# Altium footprint library elk-pi-Sika_revb.PcbLib: 102 footprints (part 5 of 7)
Each footprint in its own frame and in the unit in brackets; x right, y up, seen from the top. Pads: shape width x height; smd on the part's side, far side on the other; paste and mask are expansions set on the pad; w line width, h text height; cw(c..) or ccw(c..) is an arc to the next point about the centre after c.
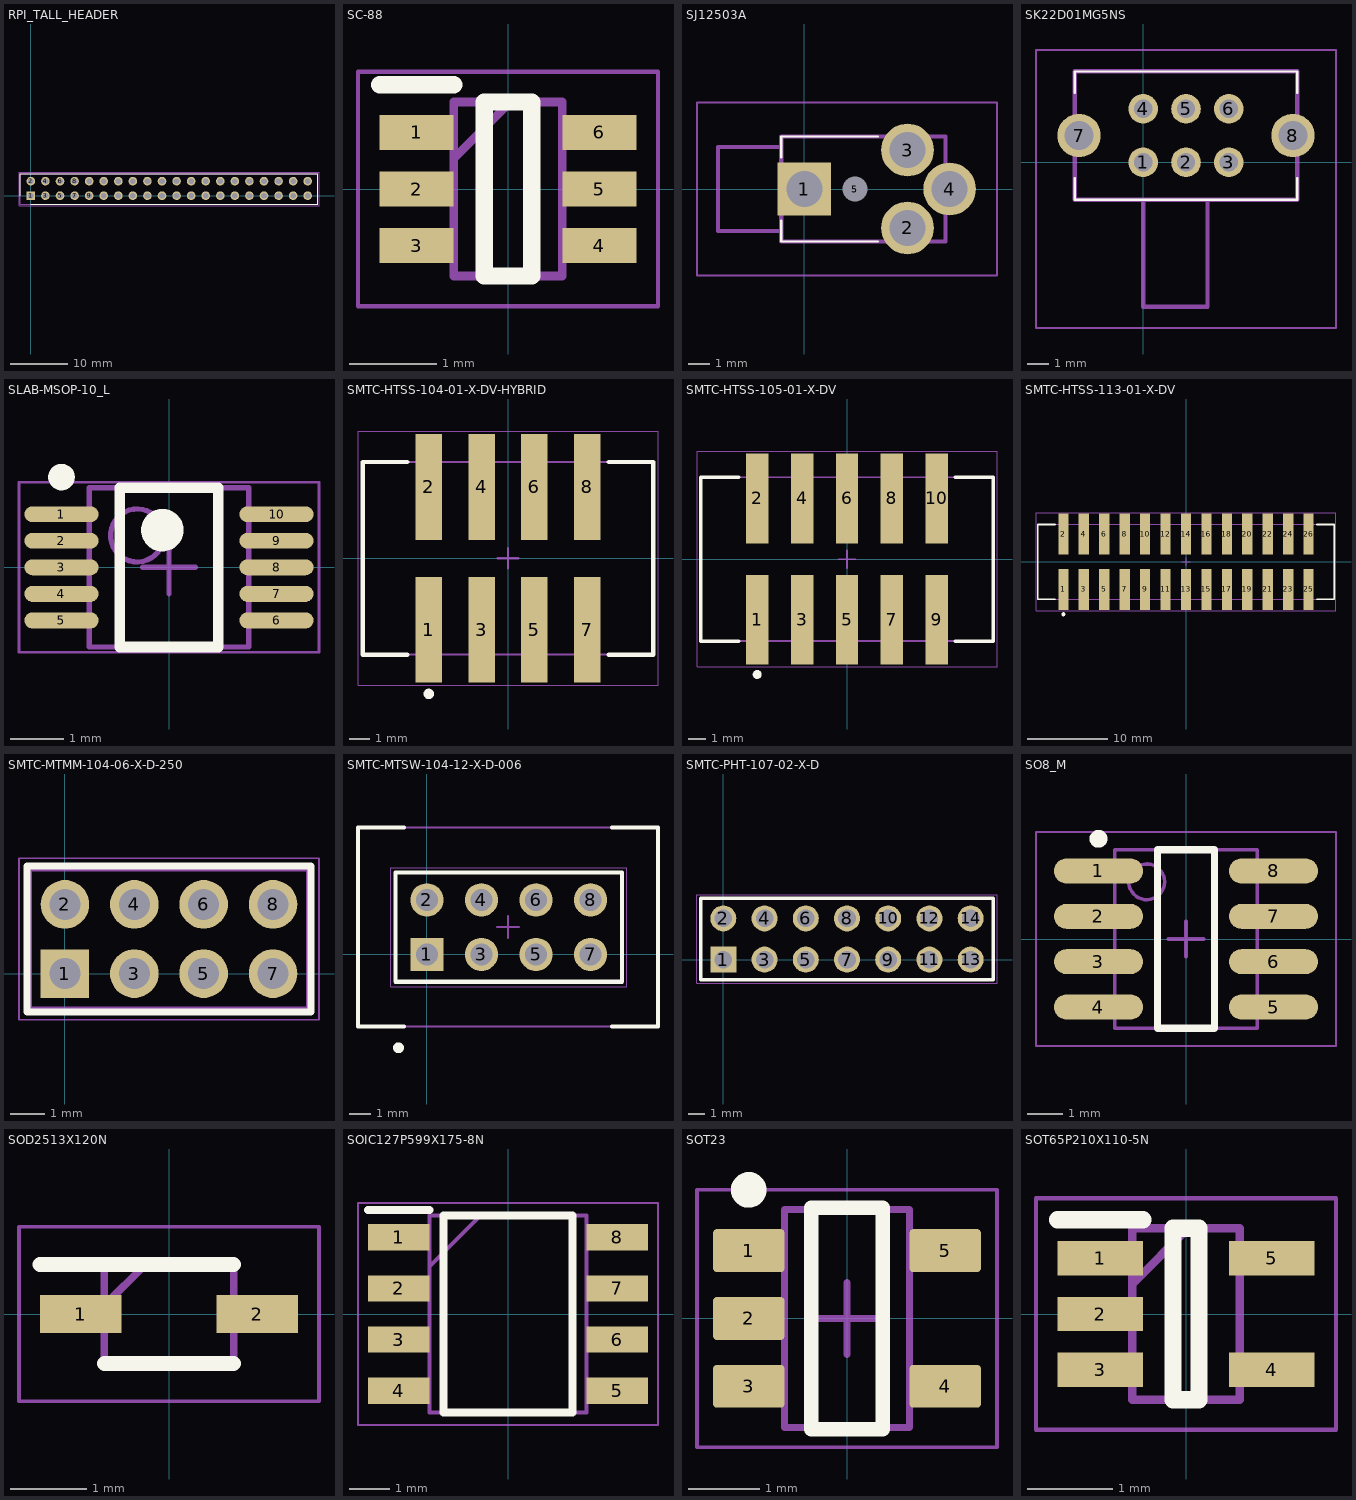
[diagram p4: the footprints below, top view; thin cyan lines are the x and y axes]

## RPI_TALL_HEADER [mm]
pads (40):
  rect 1.5x1.5 / inner round 1.5 / far side rect 1.5x1.5 hole 1: 1(0,0)
  round 1.5 hole 1: 2(0,2.54) 3(2.54,0) 4(2.54,2.54) 5(5.08,0) 6(5.08,2.54) 7(7.62,0) 8(7.62,2.54) 9(10.16,0) 10(10.16,2.54) 11(12.7,0) 12(12.7,2.54) 13(15.24,0) 14(15.24,2.54) 15(17.78,0) 16(17.78,2.54) 17(20.32,0) 18(20.32,2.54) 19(22.86,0) 20(22.86,2.54) 21(25.4,0) 22(25.4,2.54) 23(27.94,0) 24(27.94,2.54) 25(30.48,0) 26(30.48,2.54) 27(33.02,0) 28(33.02,2.54) 29(35.56,0) 30(35.56,2.54) 31(38.1,0) 32(38.1,2.54) 33(40.64,0) 34(40.64,2.54) 35(43.18,0) 36(43.18,2.54) 37(45.72,0) 38(45.72,2.54) 39(48.26,0) 40(48.26,2.54)
Top Overlay:
  lines w0.2: -1.82,0 -1.82,3.81 49.98,3.81 49.98,-1.47 0,-1.47
Mechanical 15:
  lines w0.1: -1.82,-1.47 -1.82,3.81 49.98,3.81 49.98,-1.47 -1.82,-1.47
Mechanical 20:
  lines w0.05: -2.07,-1.72 -2.07,4.06 50.23,4.06 50.23,-1.72 -2.07,-1.72
3D body: height 13.5, standoff 0, extent -1.625,-1.375 49.875,3.625

## SC-88 [mm] "SC-88, SOT23"
pads (6):
  rect 0.85x0.4 smd: 1(-1.05,0.65) 2(-1.05,0) 3(-1.05,-0.65) 4(1.05,-0.65) 5(1.05,0) 6(1.05,0.65)
Top Overlay:
  lines w0.2: -1.475,1.2 -0.625,1.2 ; -0.275,-1 0.275,-1 0.275,1 -0.275,1 -0.275,-1
Mechanical 15:
  lines w0.1: -0.625,0.35 0.025,1 ; -0.625,-1 0.625,-1 0.625,1 -0.625,1 -0.625,-1
Mechanical 20:
  lines w0.05: -1.725,-1.35 1.725,-1.35 1.725,1.35 -1.725,1.35 -1.725,-1.35
3D body "NL27WZ14DFT2G.stp": height 1.1, standoff 0, extent -1.05,-1 1.05,1

## SJ12503A [mm]
pads (5):
  rect 2.55x2.5 hole 1.7: 1(0,0)
  round 2.5 hole 1.7: 2(4.9,-1.85) 3(4.9,1.85) 4(6.9,0)
  round 0.6 hole 1.2 unplated: 5(2.4,0)
Top Overlay:
  lines w0.1: -1.1,-1.5 -1.1,-2.5 3.5,-2.5 ; -1.1,1.5 -1.1,2.5 3.5,2.5
Mechanical 15:
  lines w0.2: -1.1,-2 -4.1,-2 -4.1,2 -1.1,2 ; -1.1,-2.5 6.7,-2.5 6.7,2.5 -1.1,2.5 -1.1,-2.5
Mechanical 20:
  lines w0.1: -5.1,-4.1 9.15,-4.1 9.15,4.1 -5.1,4.1 -5.1,-4.1
3D body "SJ1-2503A.stp": height 5.01, standoff -2.49, extent -4.051,-2.54 7.099,2.46

## SK22D01MG5NS [mm]
pads (8):
  round 1.381 hole 0.85: 1(0,0) 2(2,0) 3(4,0) 4(0,2.5) 5(2,2.5) 6(4,2.5)
  round 2.025 hole 1.35: 7(-3,1.25) 8(7,1.25)
Top Overlay:
  lines w0.1: -3.2,-0.75 -3.2,-1.75 7.2,-1.75 7.2,-0.75 ; -3.2,3.25 -3.2,4.25 7.2,4.25 7.2,3.25
Mechanical 15:
  lines w0.2: 0,-1.75 0,-6.75 3,-6.75 3,-1.75 ; -3.2,-1.75 -3.2,4.25 7.2,4.25 7.2,-1.75 -3.2,-1.75
Mechanical 20:
  lines w0.1: -5.012,-7.75 -5.012,5.25 9.012,5.25 9.012,-7.75 -5.012,-7.75
3D body "SK-22D01-MG 5 NS.stp": height 4.91, standoff -3.35, extent -3.4,-6.805 7.3,4.205

## SLAB-MSOP-10_L [mm]
pads (10):
  oval 1.4x0.3 smd: 1(-2.025,1) 2(-2.025,0.5) 3(-2.025,0) 4(-2.025,-0.5) 5(-2.025,-1) 6(2.025,-1) 7(2.025,-0.5) 8(2.025,0) 9(2.025,0.5) 10(2.025,1)
Top Overlay:
  circle w0.25: c-2.025,1.7 r0.125
  circle w0.4: c-0.125,0.7 r0.2
  lines w0.2: -0.925,-1.5 -0.925,1.5 0.925,1.5 0.925,-1.5 -0.925,-1.5
Mechanical 13:
  circle w0.1: c-0.6,0.6 r0.5
  lines w0.1: -1.5,-1.5 -1.5,1.5 1.5,1.5 1.5,-1.5 -1.5,-1.5
Mechanical 15:
  lines w0.05: -2.825,-1.6 -2.825,1.6 2.825,1.6 2.825,-1.6 -2.825,-1.6
  lines w0.1: -0.5,0 0.5,0 ; 0,-0.5 0,0.5
3D body: height 1.1, standoff 0, extent -1.5,-1.5 1.5,1.5

## SMTC-HTSS-104-01-X-DV-HYBRID [mm] "High Temp Top Shroud, 2x4 Pins, Vertical, 2.54mm Pitch, Male"
height 10.41
pads (8):
  rect 1.27x5.08 smd: 1(-3.81,-3.43) 2(-3.81,3.43) 3(-1.27,-3.43) 4(-1.27,3.43) 5(1.27,-3.43) 6(1.27,3.43) 7(3.81,-3.43) 8(3.81,3.43)
Top Overlay:
  circle w0.25: c-3.81,-6.52 r0.125
  lines w0.2: -4.845,-4.635 -6.985,-4.635 -6.985,4.635 -4.845,4.635 ; 4.845,-4.635 6.985,-4.635 6.985,4.635 4.845,4.635
Mechanical 13:
  lines w0.1: -6.985,-4.635 6.985,-4.635 6.985,4.635 -6.985,4.635 -6.985,-4.635
Mechanical 15:
  lines w0.05: -7.21,-6.095 7.21,-6.095 7.21,6.095 -7.21,6.095 -7.21,-6.095
  lines w0.1: -0.5,0 0.5,0 ; 0,-0.5 0,0.5
3D body "HTSS-104-01-X-DV-HYBRID.step": height 10.16, standoff 0, extent -6.985,-5.588 6.985,5.588

## SMTC-HTSS-105-01-X-DV [mm] "High Temp Top Shroud, 2x5 Pins, Vertical, 2.54mm Pitch, Male"
height 10.41
pads (10):
  rect 1.27x5.08 smd: 1(-5.08,-3.43) 2(-5.08,3.43) 3(-2.54,-3.43) 4(-2.54,3.43) 5(0,-3.43) 6(0,3.43) 7(2.54,-3.43) 8(2.54,3.43) 9(5.08,-3.43) 10(5.08,3.43)
Top Overlay:
  circle w0.25: c-5.08,-6.52 r0.125
  lines w0.2: -6.115,-4.635 -8.255,-4.635 -8.255,4.635 -6.115,4.635 ; 6.115,-4.635 8.255,-4.635 8.255,4.635 6.115,4.635
Mechanical 13:
  lines w0.1: -8.255,-4.635 -8.255,4.635 8.255,4.635 8.255,-4.635 -8.255,-4.635
Mechanical 15:
  lines w0.05: -8.48,-6.095 -8.48,6.095 8.48,6.095 8.48,-6.095 -8.48,-6.095
  lines w0.1: -0.5,0 0.5,0 ; 0,-0.5 0,0.5
3D body "HTSS-105-01-X-DV.step": height 10.16, standoff 0, extent -8.255,-5.588 8.255,5.588

## SMTC-HTSS-113-01-X-DV [mm] "High Temp Top Shroud, 2x13 Pins, Vertical, 2.54mm Pitch, Male"
height 10.41
pads (26):
  rect 1.27x5.08 smd: 1(-15.24,-3.43) 2(-15.24,3.43) 3(-12.7,-3.43) 4(-12.7,3.43) 5(-10.16,-3.43) 6(-10.16,3.43) 7(-7.62,-3.43) 8(-7.62,3.43) 9(-5.08,-3.43) 10(-5.08,3.43) 11(-2.54,-3.43) 12(-2.54,3.43) 13(0,-3.43) 14(0,3.43) 15(2.54,-3.43) 16(2.54,3.43) 17(5.08,-3.43) 18(5.08,3.43) 19(7.62,-3.43) 20(7.62,3.43) 21(10.16,-3.43) 22(10.16,3.43) 23(12.7,-3.43) 24(12.7,3.43) 25(15.24,-3.43) 26(15.24,3.43)
Top Overlay:
  circle w0.25: c-15.24,-6.52 r0.125
  lines w0.2: -16.275,-4.635 -18.415,-4.635 -18.415,4.635 -16.275,4.635 ; 16.275,-4.635 18.415,-4.635 18.415,4.635 16.275,4.635
Mechanical 13:
  lines w0.1: -18.415,-4.635 -18.415,4.635 18.415,4.635 18.415,-4.635 -18.415,-4.635
Mechanical 15:
  lines w0.05: -18.64,-6.095 -18.64,6.095 18.64,6.095 18.64,-6.095 -18.64,-6.095
  lines w0.1: -0.5,0 0.5,0 ; 0,-0.5 0,0.5
3D body "HTSS-113-01-X-DV.step": height 10.16, standoff 0, extent -18.415,-5.588 18.415,5.588

## SMTC-MTMM-104-06-X-D-250 [mm] "Terminal Strip Assembly, 2x4 Pins, Vertical, 2mm Pitch, Male"
height 7.849
pads (8):
  rect 1.4x1.4 hole 0.89: 1(0,0)
  round 1.4 hole 0.89: 2(0,2) 3(2,0) 4(2,2) 5(4,0) 6(4,2) 7(6,0) 8(6,2)
Top Overlay:
  lines w0.2: -1.1,-1.1 -1.1,3.1 7.1,3.1 7.1,-1.1 -1.1,-1.1
Mechanical 13:
  lines w0.1: -1,-1 -1,3 7,3 7,-1 -1,-1
Mechanical 15:
  lines w0.05: -1.325,-1.325 -1.325,3.325 7.325,3.325 7.325,-1.325 -1.325,-1.325
3D body "MTMM-104-06-X-D-250.step": height 7.85, standoff -2.24, extent -0.998,-0.999 6.998,2.999

## SMTC-MTSW-104-12-X-D-006 [mm] "Assembly .025\" [.64] SQ Post Terminal Strip, 2x4 Pins, Vertical, 2.54mm Pitch, Male"
height 2.896
pads (8):
  rect 1.55x1.55 hole 1.02: 1(0,0)
  round 1.55 hole 1.02: 2(0,2.54) 3(2.54,0) 4(2.54,2.54) 5(5.08,0) 6(5.08,2.54) 7(7.62,0) 8(7.62,2.54)
Top Overlay:
  circle w0.25: c-1.325,-4.35 r0.125
  lines w0.2: -1.07,-3.36 -3.21,-3.36 -3.21,5.91 -1.07,5.91 ; 8.62,-3.36 10.76,-3.36 10.76,5.91 8.62,5.91 ; -1.46,-1.27 9.08,-1.27 9.08,3.81 -1.46,3.81 -1.46,-1.27
Mechanical 13:
  lines w0.1: -3.21,-3.36 -3.21,5.91 10.76,5.91 10.76,-3.36 -3.21,-3.36 ; -1.46,-1.27 9.08,-1.27 9.08,3.81 -1.46,3.81 -1.46,-1.27
Mechanical 15:
  lines w0.05: -1.685,-1.495 9.305,-1.495 9.305,4.035 -1.685,4.035 -1.685,-1.495
  lines w0.1: 3.275,1.275 4.275,1.275 ; 3.775,0.775 3.775,1.775
3D body "MTSW-104-12-X-D-006.step": height 2.69, standoff -23.47, extent -1.27,-1.27 8.89,3.81
3D body: height 0.25, standoff 0, extent 3.775,1.275 3.775,1.275
3D body: height 0.25, standoff 0, extent 101.1,4.4 101.1,4.4

## SMTC-PHT-107-02-X-D [mm] "Press Fit Socket Assembly, 2x7 Pins, Vertical, 2.54mm Pitch, Male"
height 10.92
pads (14):
  rect 1.6x1.6 hole 1.081: 1(0,0)
  round 1.6 hole 1.081: 2(0,2.54) 3(2.54,0) 4(2.54,2.54) 5(5.08,0) 6(5.08,2.54) 7(7.62,0) 8(7.62,2.54) 9(10.16,0) 10(10.16,2.54) 11(12.7,0) 12(12.7,2.54) 13(15.24,0) 14(15.24,2.54)
Top Overlay:
  lines w0.2: -1.395,-1.24 16.635,-1.24 16.635,3.78 -1.395,3.78 -1.395,-1.24
Mechanical 13:
  lines w0.1: -1.395,-1.24 16.635,-1.24 16.635,3.78 -1.395,3.78 -1.395,-1.24
Mechanical 15:
  lines w0.05: -1.62,-1.465 16.86,-1.465 16.86,4.005 -1.62,4.005 -1.62,-1.465
3D body "PHT-107-02-X-D.step": height 10.92, standoff -3.1, extent -1.207,-1.25 16.447,3.78

## SO8_M [mm] "SOIC, 8-Leads, Body 4.9x3.9mm, Pitch 1.27mm, IPC Low Density"
height 1.75
pads (8):
  oval 2.5x0.7 smd: 1(-2.45,1.905) 2(-2.45,0.635) 3(-2.45,-0.635) 4(-2.45,-1.905) 5(2.45,-1.905) 6(2.45,-0.635) 7(2.45,0.635) 8(2.45,1.905)
Top Overlay:
  circle w0.25: c-2.45,2.805 r0.125
  lines w0.2: -0.8,-2.5 0.8,-2.5 0.8,2.5 -0.8,2.5 -0.8,-2.5
Mechanical 13:
  circle w0.1: c-1.1,1.6 r0.5
  lines w0.1: -2,-2.5 2,-2.5 2,2.5 -2,2.5 -2,-2.5
Mechanical 15:
  lines w0.05: -4.2,-3 4.2,-3 4.2,3 -4.2,3 -4.2,-3
  lines w0.1: -0.5,0 0.5,0 ; 0,-0.5 0,0.5
3D body: height 0.25, standoff 0, extent -3.1,0.025 -3.1,0.025
3D body: height 1.75, standoff 0.1, extent -2,-2.5 2,2.5

## SOD2513X120N [mm]
pads (2):
  rect 1.075x0.5 smd: 1(-1.162,0) 2(1.162,0)
Top Overlay:
  lines w0.2: -1.7,0.65 0.85,0.65 ; -0.85,-0.65 0.85,-0.65
Mechanical 15:
  lines w0.1: -0.85,0.112 -0.312,0.65 ; -0.85,-0.65 0.85,-0.65 0.85,0.65 -0.85,0.65 -0.85,-0.65
Mechanical 20:
  lines w0.05: -1.975,-1.15 1.975,-1.15 1.975,1.15 -1.975,1.15 -1.975,-1.15

## SOIC127P599X175-8N [mm]
pads (8):
  rect 1.526x0.65 smd: 1(-2.712,1.905) 2(-2.712,0.635) 3(-2.712,-0.635) 4(-2.712,-1.905) 5(2.712,-1.905) 6(2.712,-0.635) 7(2.712,0.635) 8(2.712,1.905)
Top Overlay:
  lines w0.2: -3.475,2.58 -1.95,2.58 ; -1.6,-2.451 -1.6,2.451 1.6,2.451 1.6,-2.451 -1.6,-2.451
Mechanical 15:
  lines w0.1: -1.95,1.181 -0.68,2.451 ; -1.95,-2.451 -1.95,2.451 1.95,2.451 1.95,-2.451 -1.95,-2.451
Mechanical 20:
  lines w0.05: -3.725,-2.752 -3.725,2.752 3.725,2.752 3.725,-2.752 -3.725,-2.752

## SOT23 [mm] "SOT23, 5-Leads, Body 3.05x1.75mm, Pitch 0.95mm, IPC Medium Density"
height 1.45
pads (5):
  rrect17% 1x0.6 smd: 1(-1.375,0.95) 2(-1.375,0) 3(-1.375,-0.95) 4(1.375,-0.95) 5(1.375,0.95)
Top Overlay:
  circle w0.25: c-1.375,1.8 r0.125
  lines w0.2: -0.5,-1.55 0.5,-1.55 0.5,1.55 -0.5,1.55 -0.5,-1.55
Mechanical 1:
  text ".Designator" at -0.635,-0.254 h0.4
Mechanical 13:
  lines w0.1: -0.875,-1.525 -0.875,1.525 0.875,1.525 0.875,-1.525 -0.875,-1.525
Mechanical 15:
  lines w0.05: -2.1,-1.8 -2.1,1.8 2.1,1.8 2.1,-1.8 -2.1,-1.8
  lines w0.1: -0.5,0 0.5,0 ; 0,-0.5 0,0.5
3D body "DBV0005AaksMF05A.stp": height 1.08, standoff -0.01, extent -1.422,-1.461 1.422,1.46

## SOT65P210X110-5N [mm]
pads (5):
  rect 1x0.4 smd: 1(-1,0.65) 2(-1,0) 3(-1,-0.65) 4(1,-0.65) 5(1,0.65)
Top Overlay:
  lines w0.2: -1.5,1.1 -0.5,1.1 ; -0.15,-1 0.15,-1 0.15,1 -0.15,1 -0.15,-1
Mechanical 15:
  lines w0.1: -0.625,0.35 0.025,1 ; -0.625,-1 0.625,-1 0.625,1 -0.625,1 -0.625,-1
Mechanical 20:
  lines w0.05: -1.75,-1.35 1.75,-1.35 1.75,1.35 -1.75,1.35 -1.75,-1.35